# Altium schematic symbol library MCU_ST_STM32L4.SchLib: 319 symbols (part 3 of 8) (continued)
## STM32L4R9AIIx (continued)

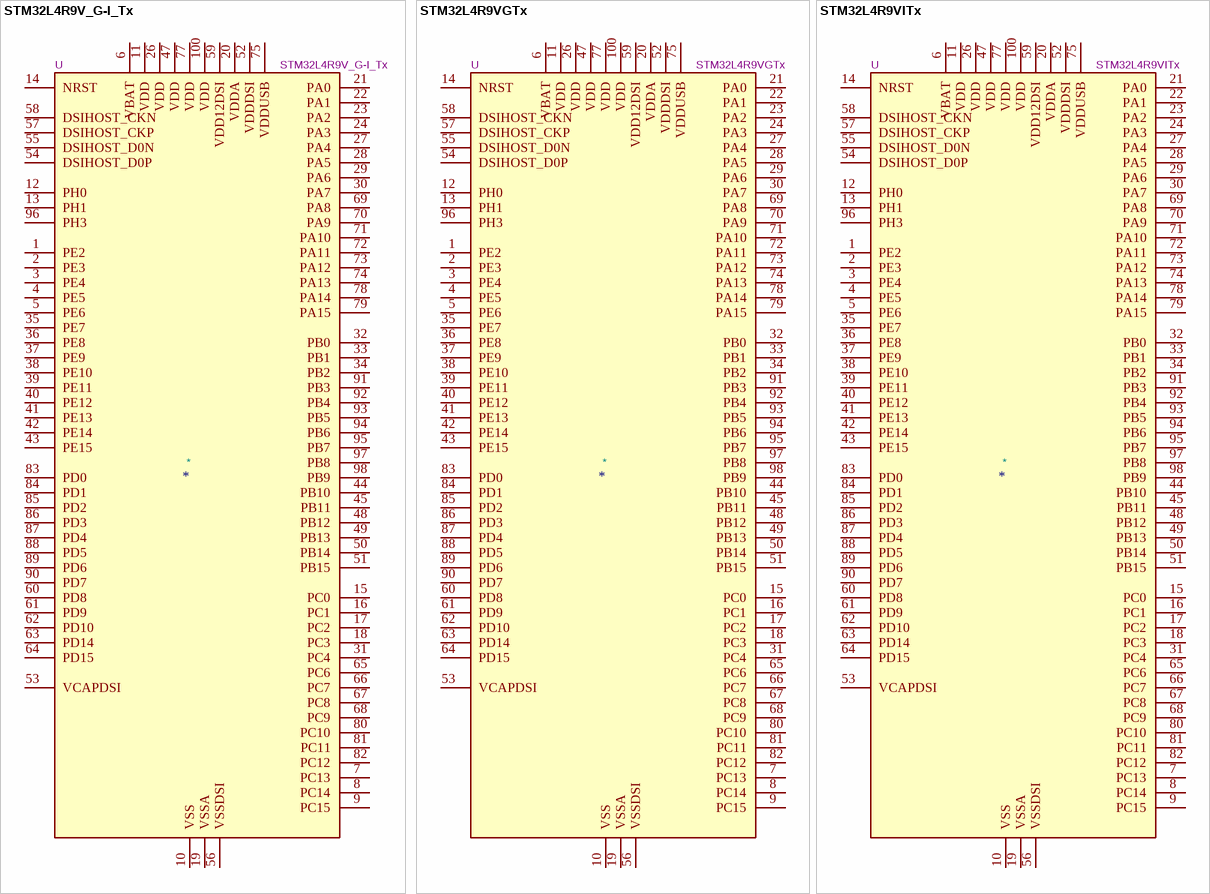
[diagram p22: symbols STM32L4R9V_G-I_Tx to STM32L4R9VITx]

## STM32L4R9V_G-I_Tx
designator *  value STM32L4R9V_G-I_Tx  Reference: U
ki_keywords: Arm Cortex-M4 STM32L4+ STM32L4R9/S9; ki_description: STMicroelectronics Arm Cortex-M4 MCU, 1024-2048KB flash, 640KB RAM, 120 MHz, 1.71-3.6V, 77 GPIO, LQFP100; ki_fp_filters: LQFP*14x14mm*P0.5mm*; Footprint: Package_QFP:LQFP-100_14x14mm_P0.5mm; Datasheet: https://www.st.com/resource/en/datasheet/stm32l4r9vg.pdf
pins: 1 PE2, 2 PE3, 3 PE4, 4 PE5, 5 PE6, 6 VBAT, 7 PC13, 8 PC14, 9 PC15, 10 VSS, 11 VDD, 12 PH0, 13 PH1, 14 NRST, 15 PC0, 16 PC1, 17 PC2, 18 PC3, 19 VSSA, 20 VDDA, 21 PA0, 22 PA1, 23 PA2, 24 PA3, 25 VSS hidden, 26 VDD, 27 PA4, 28 PA5, 29 PA6, 30 PA7, 31 PC4, 32 PB0, 33 PB1, 34 PB2, 35 PE7, 36 PE8, 37 PE9, 38 PE10, 39 PE11, 40 PE12, 41 PE13, 42 PE14, 43 PE15, 44 PB10, 45 PB11, 46 VSS hidden, 47 VDD, 48 PB12, 49 PB13, 50 PB14, 51 PB15, 52 VDDDSI, 53 VCAPDSI, 54 DSIHOST_D0P, 55 DSIHOST_D0N, 56 VSSDSI, 57 DSIHOST_CKP, 58 DSIHOST_CKN, 59 VDD12DSI, 60 PD8, 61 PD9, 62 PD10, 63 PD14, 64 PD15, 65 PC6, 66 PC7, 67 PC8, 68 PC9, 69 PA8, 70 PA9, 71 PA10, 72 PA11, 73 PA12, 74 PA13, 75 VDDUSB, 76 VSS hidden, 77 VDD, 78 PA14, 79 PA15, 80 PC10, 81 PC11, 82 PC12, 83 PD0, 84 PD1, 85 PD2, 86 PD3, 87 PD4, 88 PD5, 89 PD6, 90 PD7, 91 PB3, 92 PB4, 93 PB5, 94 PB6, 95 PB7, 96 PH3, 97 PB8, 98 PB9, 99 VSS hidden, 100 VDD

## STM32L4R9VGTx
designator *  value STM32L4R9VGTx  Reference: U
ki_keywords: Arm Cortex-M4 STM32L4+ STM32L4R9/S9; ki_description: STMicroelectronics Arm Cortex-M4 MCU, 1024KB flash, 640KB RAM, 120 MHz, 1.71-3.6V, 77 GPIO, LQFP100; ki_fp_filters: LQFP*14x14mm*P0.5mm*; Footprint: Package_QFP:LQFP-100_14x14mm_P0.5mm; Datasheet: https://www.st.com/resource/en/datasheet/stm32l4r9vg.pdf
pins: 1 PE2, 2 PE3, 3 PE4, 4 PE5, 5 PE6, 6 VBAT, 7 PC13, 8 PC14, 9 PC15, 10 VSS, 11 VDD, 12 PH0, 13 PH1, 14 NRST, 15 PC0, 16 PC1, 17 PC2, 18 PC3, 19 VSSA, 20 VDDA, 21 PA0, 22 PA1, 23 PA2, 24 PA3, 25 VSS hidden, 26 VDD, 27 PA4, 28 PA5, 29 PA6, 30 PA7, 31 PC4, 32 PB0, 33 PB1, 34 PB2, 35 PE7, 36 PE8, 37 PE9, 38 PE10, 39 PE11, 40 PE12, 41 PE13, 42 PE14, 43 PE15, 44 PB10, 45 PB11, 46 VSS hidden, 47 VDD, 48 PB12, 49 PB13, 50 PB14, 51 PB15, 52 VDDDSI, 53 VCAPDSI, 54 DSIHOST_D0P, 55 DSIHOST_D0N, 56 VSSDSI, 57 DSIHOST_CKP, 58 DSIHOST_CKN, 59 VDD12DSI, 60 PD8, 61 PD9, 62 PD10, 63 PD14, 64 PD15, 65 PC6, 66 PC7, 67 PC8, 68 PC9, 69 PA8, 70 PA9, 71 PA10, 72 PA11, 73 PA12, 74 PA13, 75 VDDUSB, 76 VSS hidden, 77 VDD, 78 PA14, 79 PA15, 80 PC10, 81 PC11, 82 PC12, 83 PD0, 84 PD1, 85 PD2, 86 PD3, 87 PD4, 88 PD5, 89 PD6, 90 PD7, 91 PB3, 92 PB4, 93 PB5, 94 PB6, 95 PB7, 96 PH3, 97 PB8, 98 PB9, 99 VSS hidden, 100 VDD

## STM32L4R9VITx
designator *  value STM32L4R9VITx  Reference: U
ki_keywords: Arm Cortex-M4 STM32L4+ STM32L4R9/S9; ki_description: STMicroelectronics Arm Cortex-M4 MCU, 2048KB flash, 640KB RAM, 120 MHz, 1.71-3.6V, 77 GPIO, LQFP100; ki_fp_filters: LQFP*14x14mm*P0.5mm*; Footprint: Package_QFP:LQFP-100_14x14mm_P0.5mm; Datasheet: https://www.st.com/resource/en/datasheet/stm32l4r9vi.pdf
pins: 1 PE2, 2 PE3, 3 PE4, 4 PE5, 5 PE6, 6 VBAT, 7 PC13, 8 PC14, 9 PC15, 10 VSS, 11 VDD, 12 PH0, 13 PH1, 14 NRST, 15 PC0, 16 PC1, 17 PC2, 18 PC3, 19 VSSA, 20 VDDA, 21 PA0, 22 PA1, 23 PA2, 24 PA3, 25 VSS hidden, 26 VDD, 27 PA4, 28 PA5, 29 PA6, 30 PA7, 31 PC4, 32 PB0, 33 PB1, 34 PB2, 35 PE7, 36 PE8, 37 PE9, 38 PE10, 39 PE11, 40 PE12, 41 PE13, 42 PE14, 43 PE15, 44 PB10, 45 PB11, 46 VSS hidden, 47 VDD, 48 PB12, 49 PB13, 50 PB14, 51 PB15, 52 VDDDSI, 53 VCAPDSI, 54 DSIHOST_D0P, 55 DSIHOST_D0N, 56 VSSDSI, 57 DSIHOST_CKP, 58 DSIHOST_CKN, 59 VDD12DSI, 60 PD8, 61 PD9, 62 PD10, 63 PD14, 64 PD15, 65 PC6, 66 PC7, 67 PC8, 68 PC9, 69 PA8, 70 PA9, 71 PA10, 72 PA11, 73 PA12, 74 PA13, 75 VDDUSB, 76 VSS hidden, 77 VDD, 78 PA14, 79 PA15, 80 PC10, 81 PC11, 82 PC12, 83 PD0, 84 PD1, 85 PD2, 86 PD3, 87 PD4, 88 PD5, 89 PD6, 90 PD7, 91 PB3, 92 PB4, 93 PB5, 94 PB6, 95 PB7, 96 PH3, 97 PB8, 98 PB9, 99 VSS hidden, 100 VDD

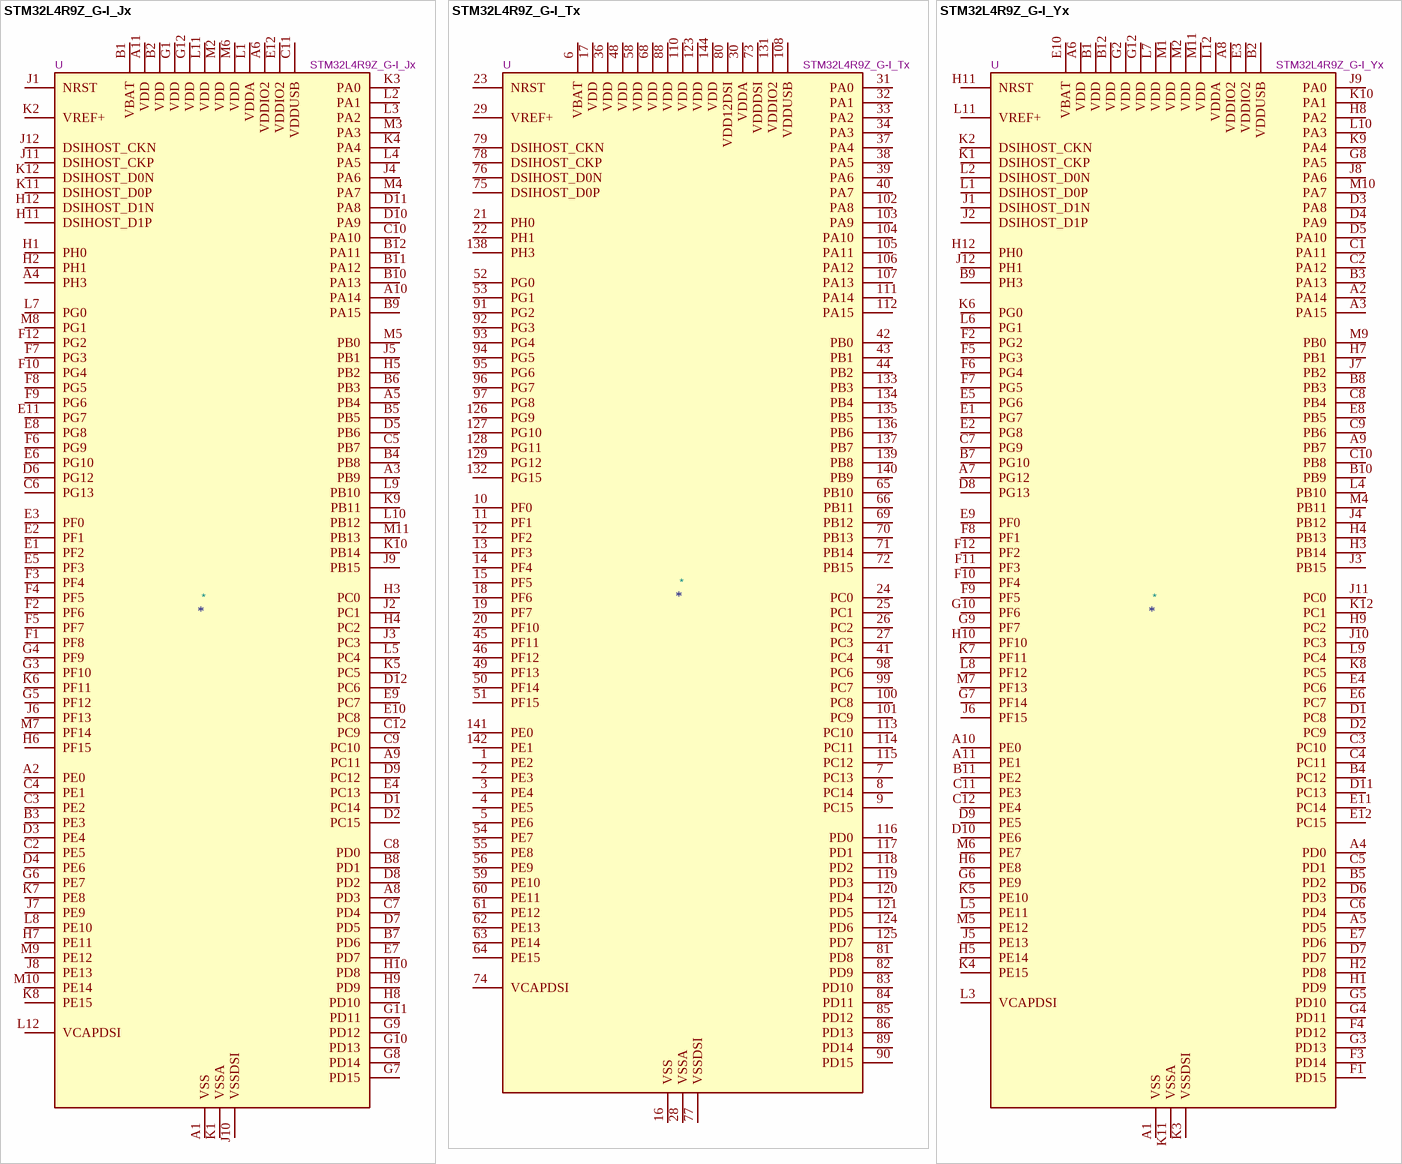
[diagram p23: symbols STM32L4R9Z_G-I_Jx to STM32L4R9Z_G-I_Yx]

## STM32L4R9Z_G-I_Jx
designator *  value STM32L4R9Z_G-I_Jx  Reference: U
ki_keywords: Arm Cortex-M4 STM32L4+ STM32L4R9/S9; ki_description: STMicroelectronics Arm Cortex-M4 MCU, 1024-2048KB flash, 640KB RAM, 120 MHz, 1.71-3.6V, 112 GPIO, UFBGA144; ki_fp_filters: *UFBGA*10x10mm*Layout12x12*P0.8mm*; Footprint: Package_BGA:UFBGA-144_10x10mm_Layout12x12_P0.8mm; Datasheet: https://www.st.com/resource/en/datasheet/stm32l4r9zg.pdf
pins: A1 VSS, A2 PE0, A3 PB9, A4 PH3, A5 PB4, A6 VDDIO2, A7 VSS hidden, A8 PD3, A9 PC11, A10 PA14, A11 VDD, A12 VSS hidden, B1 VBAT, B2 VDD, B3 PE3, B4 PB8, B5 PB5, B6 PB3, B7 PD6, B8 PD1, B9 PA15, B10 PA13, B11 PA12, B12 PA11, C1 VSS hidden, C2 PE5, C3 PE2, C4 PE1, C5 PB7, C6 PG13, C7 PD4, C8 PD0, C9 PC10, C10 PA10, C11 VDDUSB, C12 PC9, D1 PC14, D2 PC15, D3 PE4, D4 PE6, D5 PB6, D6 PG12, D7 PD5, D8 PD2, D9 PC12, D10 PA9, D11 PA8, D12 PC6, E1 PF2, E2 PF1, E3 PF0, E4 PC13, E5 PF3, E6 PG10, E7 PD7, E8 PG8, E9 PC7, E10 PC8, E11 PG7, E12 VDDIO2, F1 PF8, F2 PF6, F3 PF4, F4 PF5, F5 PF7, F6 PG9, F7 PG3, F8 PG5, F9 PG6, F10 PG4, F11 VSS hidden, F12 PG2, G1 VDD, G2 VSS hidden, G3 PF10, G4 PF9, G5 PF12, G6 PE7, G7 PD15, G8 PD14, G9 PD12, G10 PD13, G11 PD11, G12 VDD, H1 PH0, H2 PH1, H3 PC0, H4 PC2, H5 PB2, H6 PF15, H7 PE11, H8 PD10, H9 PD9, H10 PD8, H11 DSIHOST_D1P, H12 DSIHOST_D1N, J1 NRST, J2 PC1, J3 PC3, J4 PA6, J5 PB1, J6 PF13, J7 PE9, J8 PE13, J9 PB15, J10 VSSDSI, J11 DSIHOST_CKP, J12 DSIHOST_CKN, K1 VSSA, K2 VREF+, K3 PA0, K4 PA4, K5 PC5, K6 PF11, K7 PE8, K8 PE15, K9 PB11, K10 PB14, K11 DSIHOST_D0P, K12 DSIHOST_D0N, L1 VDDA, L2 PA1, L3 PA2, L4 PA5, L5 PC4, L6 VSS hidden, L7 PG0, L8 PE10, L9 PB10, L10 PB12, L11 VDD, L12 VCAPDSI, M1 VSS hidden, M2 VDD, M3 PA3, M4 PA7, M5 PB0, M6 VDD, M7 PF14, M8 PG1, M9 PE12, M10 PE14, M11 PB13, M12 VSS hidden

## STM32L4R9Z_G-I_Tx
designator *  value STM32L4R9Z_G-I_Tx  Reference: U
ki_keywords: Arm Cortex-M4 STM32L4+ STM32L4R9/S9; ki_description: STMicroelectronics Arm Cortex-M4 MCU, 1024-2048KB flash, 640KB RAM, 120 MHz, 1.71-3.6V, 110 GPIO, LQFP144; ki_fp_filters: LQFP*20x20mm*P0.5mm*; Footprint: Package_QFP:LQFP-144_20x20mm_P0.5mm; Datasheet: https://www.st.com/resource/en/datasheet/stm32l4r9zg.pdf
pins: 1 PE2, 2 PE3, 3 PE4, 4 PE5, 5 PE6, 6 VBAT, 7 PC13, 8 PC14, 9 PC15, 10 PF0, 11 PF1, 12 PF2, 13 PF3, 14 PF4, 15 PF5, 16 VSS, 17 VDD, 18 PF6, 19 PF7, 20 PF10, 21 PH0, 22 PH1, 23 NRST, 24 PC0, 25 PC1, 26 PC2, 27 PC3, 28 VSSA, 29 VREF+, 30 VDDA, 31 PA0, 32 PA1, 33 PA2, 34 PA3, 35 VSS hidden, 36 VDD, 37 PA4, 38 PA5, 39 PA6, 40 PA7, 41 PC4, 42 PB0, 43 PB1, 44 PB2, 45 PF11, 46 PF12, 47 VSS hidden, 48 VDD, 49 PF13, 50 PF14, 51 PF15, 52 PG0, 53 PG1, 54 PE7, 55 PE8, 56 PE9, 57 VSS hidden, 58 VDD, 59 PE10, 60 PE11, 61 PE12, 62 PE13, 63 PE14, 64 PE15, 65 PB10, 66 PB11, 67 VSS hidden, 68 VDD, 69 PB12, 70 PB13, 71 PB14, 72 PB15, 73 VDDDSI, 74 VCAPDSI, 75 DSIHOST_D0P, 76 DSIHOST_D0N, 77 VSSDSI, 78 DSIHOST_CKP, 79 DSIHOST_CKN, 80 VDD12DSI, 81 PD8, 82 PD9, 83 PD10, 84 PD11, 85 PD12, 86 PD13, 87 VSS hidden, 88 VDD, 89 PD14, 90 PD15, 91 PG2, 92 PG3, 93 PG4, 94 PG5, 95 PG6, 96 PG7, 97 PG8, 98 PC6, 99 PC7, 100 PC8, 101 PC9, 102 PA8, 103 PA9, 104 PA10, 105 PA11, 106 PA12, 107 PA13, 108 VDDUSB, 109 VSS hidden, 110 VDD, 111 PA14, 112 PA15, 113 PC10, 114 PC11, 115 PC12, 116 PD0, 117 PD1, 118 PD2, 119 PD3, 120 PD4, 121 PD5, 122 VSS hidden, 123 VDD, 124 PD6, 125 PD7, 126 PG9, 127 PG10, 128 PG11, 129 PG12, 130 VSS hidden, 131 VDDIO2, 132 PG15, 133 PB3, 134 PB4, 135 PB5, 136 PB6, 137 PB7, 138 PH3, 139 PB8, 140 PB9, 141 PE0, 142 PE1, 143 VSS hidden, 144 VDD

## STM32L4R9Z_G-I_Yx
designator *  value STM32L4R9Z_G-I_Yx  Reference: U
ki_keywords: Arm Cortex-M4 STM32L4+ STM32L4R9/S9; ki_description: STMicroelectronics Arm Cortex-M4 MCU, 1024-2048KB flash, 640KB RAM, 120 MHz, 1.71-3.6V, 110 GPIO, WLCSP144; ki_fp_filters: ST*WLCSP*Die470*; Footprint: Package_CSP:ST_WLCSP-144_Die470; Datasheet: https://www.st.com/resource/en/datasheet/stm32l4r9zg.pdf
pins: A1 VSS, A2 PA14, A3 PA15, A4 PD0, A5 PD5, A6 VDD, A7 PG12, A8 VDDIO2, A9 PB7, A10 PE0, A11 PE1, A12 VSS hidden, B1 VDD, B2 VDDUSB, B3 PA13, B4 PC12, B5 PD2, B6 VSS hidden, B7 PG10, B8 PB3, B9 PH3, B10 PB9, B11 PE2, B12 VDD, C1 PA11, C2 PA12, C3 PC10, C4 PC11, C5 PD1, C6 PD4, C7 PG9, C8 PB4, C9 PB6, C10 PB8, C11 PE3, C12 PE4, D1 PC8, D2 PC9, D3 PA8, D4 PA9, D5 PA10, D6 PD3, D7 PD7, D8 PG13, D9 PE5, D10 PE6, D11 PC13, D12 VSS hidden, E1 PG7, E2 PG8, E3 VDDIO2, E4 PC6, E5 PG6, E6 PC7, E7 PD6, E8 PB5, E9 PF0, E10 VBAT, E11 PC14, E12 PC15, F1 PD15, F2 PG2, F3 PD14, F4 PD12, F5 PG3, F6 PG4, F7 PG5, F8 PF1, F9 PF5, F10 PF4, F11 PF3, F12 PF2, G1 VSS hidden, G2 VDD, G3 PD13, G4 PD11, G5 PD10, G6 PE9, G7 PF14, G8 PA5, G9 PF7, G10 PF6, G11 VSS hidden, G12 VDD, H1 PD9, H2 PD8, H3 PB14, H4 PB13, H5 PE14, H6 PE8, H7 PB1, H8 PA2, H9 PC2, H10 PF10, H11 NRST, H12 PH0, J1 DSIHOST_D1N, J2 DSIHOST_D1P, J3 PB15, J4 PB12, J5 PE13, J6 PF15, J7 PB2, J8 PA6, J9 PA0, J10 PC3, J11 PC0, J12 PH1, K1 DSIHOST_CKP, K2 DSIHOST_CKN, K3 VSSDSI, K4 PE15, K5 PE10, K6 PG0, K7 PF11, K8 PC5, K9 PA4, K10 PA1, K11 VSSA, K12 PC1, L1 DSIHOST_D0P, L2 DSIHOST_D0N, L3 VCAPDSI, L4 PB10, L5 PE11, L6 PG1, L7 VDD, L8 PF12, L9 PC4, L10 PA3, L11 VREF+, L12 VDDA, M1 VDD, M2 VDD, M3 VSS hidden, M4 PB11, M5 PE12, M6 PE7, M7 PF13, M8 VSS hidden, M9 PB0, M10 PA7, M11 VDD, M12 VSS hidden

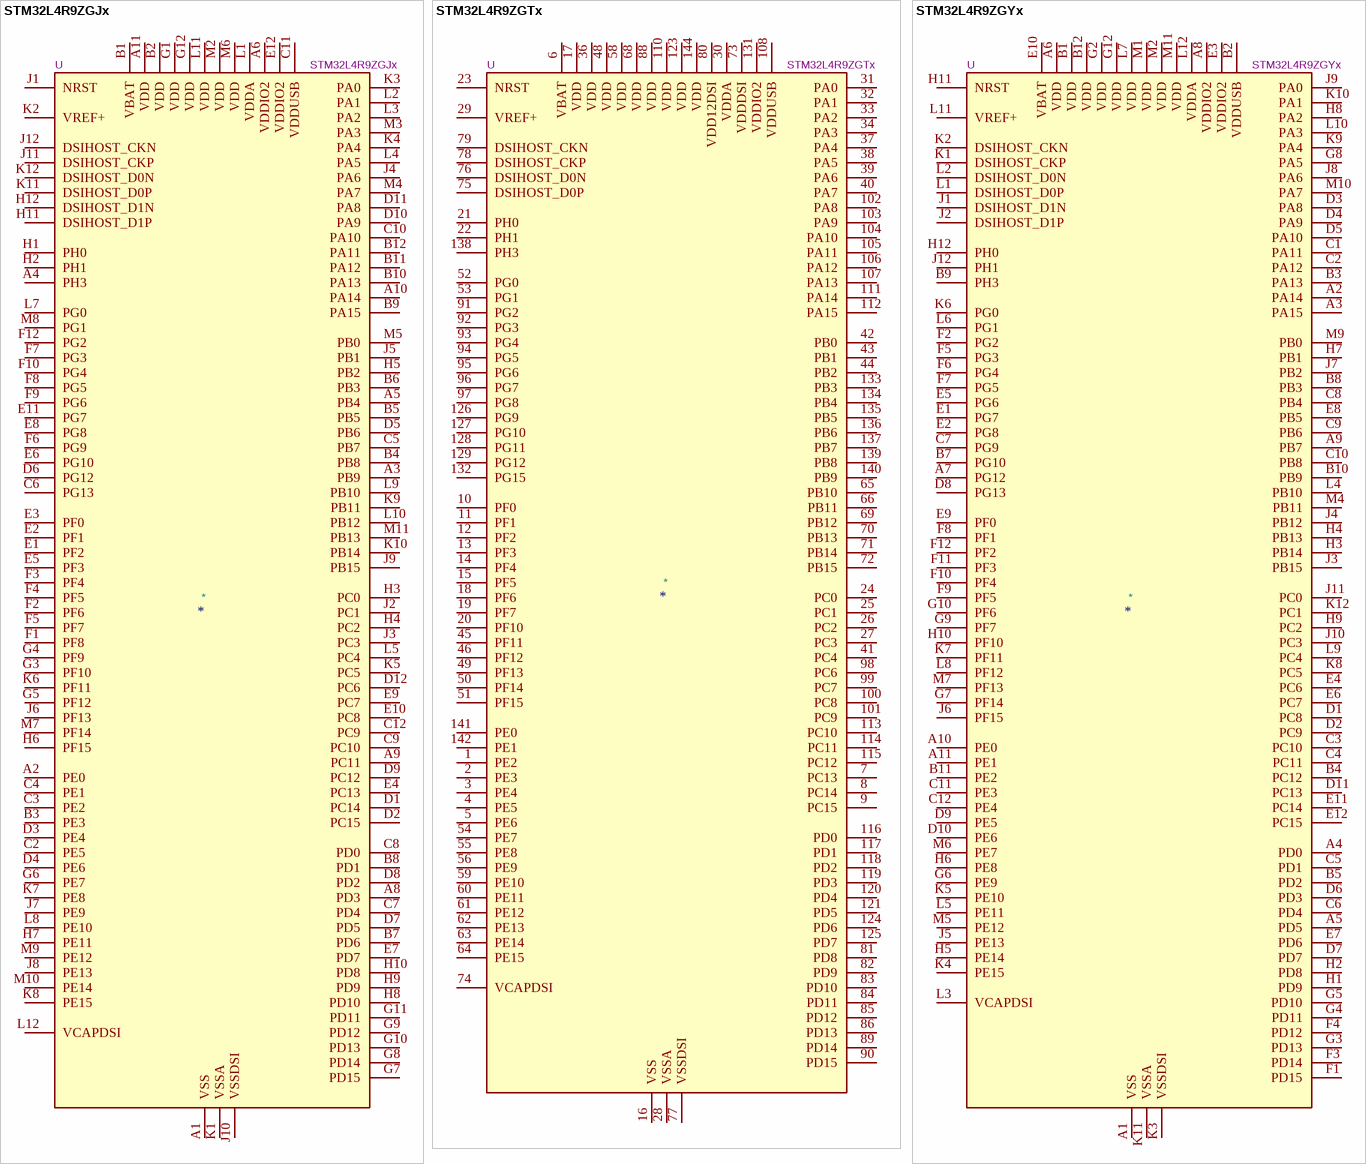
[diagram p24: symbols STM32L4R9ZGJx to STM32L4R9ZGYx]

## STM32L4R9ZGJx
designator *  value STM32L4R9ZGJx  Reference: U
ki_keywords: Arm Cortex-M4 STM32L4+ STM32L4R9/S9; ki_description: STMicroelectronics Arm Cortex-M4 MCU, 1024KB flash, 640KB RAM, 120 MHz, 1.71-3.6V, 112 GPIO, UFBGA144; ki_fp_filters: *UFBGA*10x10mm*Layout12x12*P0.8mm*; Footprint: Package_BGA:UFBGA-144_10x10mm_Layout12x12_P0.8mm; Datasheet: https://www.st.com/resource/en/datasheet/stm32l4r9zg.pdf
pins: A1 VSS, A2 PE0, A3 PB9, A4 PH3, A5 PB4, A6 VDDIO2, A7 VSS hidden, A8 PD3, A9 PC11, A10 PA14, A11 VDD, A12 VSS hidden, B1 VBAT, B2 VDD, B3 PE3, B4 PB8, B5 PB5, B6 PB3, B7 PD6, B8 PD1, B9 PA15, B10 PA13, B11 PA12, B12 PA11, C1 VSS hidden, C2 PE5, C3 PE2, C4 PE1, C5 PB7, C6 PG13, C7 PD4, C8 PD0, C9 PC10, C10 PA10, C11 VDDUSB, C12 PC9, D1 PC14, D2 PC15, D3 PE4, D4 PE6, D5 PB6, D6 PG12, D7 PD5, D8 PD2, D9 PC12, D10 PA9, D11 PA8, D12 PC6, E1 PF2, E2 PF1, E3 PF0, E4 PC13, E5 PF3, E6 PG10, E7 PD7, E8 PG8, E9 PC7, E10 PC8, E11 PG7, E12 VDDIO2, F1 PF8, F2 PF6, F3 PF4, F4 PF5, F5 PF7, F6 PG9, F7 PG3, F8 PG5, F9 PG6, F10 PG4, F11 VSS hidden, F12 PG2, G1 VDD, G2 VSS hidden, G3 PF10, G4 PF9, G5 PF12, G6 PE7, G7 PD15, G8 PD14, G9 PD12, G10 PD13, G11 PD11, G12 VDD, H1 PH0, H2 PH1, H3 PC0, H4 PC2, H5 PB2, H6 PF15, H7 PE11, H8 PD10, H9 PD9, H10 PD8, H11 DSIHOST_D1P, H12 DSIHOST_D1N, J1 NRST, J2 PC1, J3 PC3, J4 PA6, J5 PB1, J6 PF13, J7 PE9, J8 PE13, J9 PB15, J10 VSSDSI, J11 DSIHOST_CKP, J12 DSIHOST_CKN, K1 VSSA, K2 VREF+, K3 PA0, K4 PA4, K5 PC5, K6 PF11, K7 PE8, K8 PE15, K9 PB11, K10 PB14, K11 DSIHOST_D0P, K12 DSIHOST_D0N, L1 VDDA, L2 PA1, L3 PA2, L4 PA5, L5 PC4, L6 VSS hidden, L7 PG0, L8 PE10, L9 PB10, L10 PB12, L11 VDD, L12 VCAPDSI, M1 VSS hidden, M2 VDD, M3 PA3, M4 PA7, M5 PB0, M6 VDD, M7 PF14, M8 PG1, M9 PE12, M10 PE14, M11 PB13, M12 VSS hidden

## STM32L4R9ZGTx
designator *  value STM32L4R9ZGTx  Reference: U
ki_keywords: Arm Cortex-M4 STM32L4+ STM32L4R9/S9; ki_description: STMicroelectronics Arm Cortex-M4 MCU, 1024KB flash, 640KB RAM, 120 MHz, 1.71-3.6V, 110 GPIO, LQFP144; ki_fp_filters: LQFP*20x20mm*P0.5mm*; Footprint: Package_QFP:LQFP-144_20x20mm_P0.5mm; Datasheet: https://www.st.com/resource/en/datasheet/stm32l4r9zg.pdf
pins: 1 PE2, 2 PE3, 3 PE4, 4 PE5, 5 PE6, 6 VBAT, 7 PC13, 8 PC14, 9 PC15, 10 PF0, 11 PF1, 12 PF2, 13 PF3, 14 PF4, 15 PF5, 16 VSS, 17 VDD, 18 PF6, 19 PF7, 20 PF10, 21 PH0, 22 PH1, 23 NRST, 24 PC0, 25 PC1, 26 PC2, 27 PC3, 28 VSSA, 29 VREF+, 30 VDDA, 31 PA0, 32 PA1, 33 PA2, 34 PA3, 35 VSS hidden, 36 VDD, 37 PA4, 38 PA5, 39 PA6, 40 PA7, 41 PC4, 42 PB0, 43 PB1, 44 PB2, 45 PF11, 46 PF12, 47 VSS hidden, 48 VDD, 49 PF13, 50 PF14, 51 PF15, 52 PG0, 53 PG1, 54 PE7, 55 PE8, 56 PE9, 57 VSS hidden, 58 VDD, 59 PE10, 60 PE11, 61 PE12, 62 PE13, 63 PE14, 64 PE15, 65 PB10, 66 PB11, 67 VSS hidden, 68 VDD, 69 PB12, 70 PB13, 71 PB14, 72 PB15, 73 VDDDSI, 74 VCAPDSI, 75 DSIHOST_D0P, 76 DSIHOST_D0N, 77 VSSDSI, 78 DSIHOST_CKP, 79 DSIHOST_CKN, 80 VDD12DSI, 81 PD8, 82 PD9, 83 PD10, 84 PD11, 85 PD12, 86 PD13, 87 VSS hidden, 88 VDD, 89 PD14, 90 PD15, 91 PG2, 92 PG3, 93 PG4, 94 PG5, 95 PG6, 96 PG7, 97 PG8, 98 PC6, 99 PC7, 100 PC8, 101 PC9, 102 PA8, 103 PA9, 104 PA10, 105 PA11, 106 PA12, 107 PA13, 108 VDDUSB, 109 VSS hidden, 110 VDD, 111 PA14, 112 PA15, 113 PC10, 114 PC11, 115 PC12, 116 PD0, 117 PD1, 118 PD2, 119 PD3, 120 PD4, 121 PD5, 122 VSS hidden, 123 VDD, 124 PD6, 125 PD7, 126 PG9, 127 PG10, 128 PG11, 129 PG12, 130 VSS hidden, 131 VDDIO2, 132 PG15, 133 PB3, 134 PB4, 135 PB5, 136 PB6, 137 PB7, 138 PH3, 139 PB8, 140 PB9, 141 PE0, 142 PE1, 143 VSS hidden, 144 VDD

## STM32L4R9ZGYx
designator *  value STM32L4R9ZGYx  Reference: U
ki_keywords: Arm Cortex-M4 STM32L4+ STM32L4R9/S9; ki_description: STMicroelectronics Arm Cortex-M4 MCU, 1024KB flash, 640KB RAM, 120 MHz, 1.71-3.6V, 110 GPIO, WLCSP144; ki_fp_filters: ST*WLCSP*Die470*; Footprint: Package_CSP:ST_WLCSP-144_Die470; Datasheet: https://www.st.com/resource/en/datasheet/stm32l4r9zg.pdf
pins: A1 VSS, A2 PA14, A3 PA15, A4 PD0, A5 PD5, A6 VDD, A7 PG12, A8 VDDIO2, A9 PB7, A10 PE0, A11 PE1, A12 VSS hidden, B1 VDD, B2 VDDUSB, B3 PA13, B4 PC12, B5 PD2, B6 VSS hidden, B7 PG10, B8 PB3, B9 PH3, B10 PB9, B11 PE2, B12 VDD, C1 PA11, C2 PA12, C3 PC10, C4 PC11, C5 PD1, C6 PD4, C7 PG9, C8 PB4, C9 PB6, C10 PB8, C11 PE3, C12 PE4, D1 PC8, D2 PC9, D3 PA8, D4 PA9, D5 PA10, D6 PD3, D7 PD7, D8 PG13, D9 PE5, D10 PE6, D11 PC13, D12 VSS hidden, E1 PG7, E2 PG8, E3 VDDIO2, E4 PC6, E5 PG6, E6 PC7, E7 PD6, E8 PB5, E9 PF0, E10 VBAT, E11 PC14, E12 PC15, F1 PD15, F2 PG2, F3 PD14, F4 PD12, F5 PG3, F6 PG4, F7 PG5, F8 PF1, F9 PF5, F10 PF4, F11 PF3, F12 PF2, G1 VSS hidden, G2 VDD, G3 PD13, G4 PD11, G5 PD10, G6 PE9, G7 PF14, G8 PA5, G9 PF7, G10 PF6, G11 VSS hidden, G12 VDD, H1 PD9, H2 PD8, H3 PB14, H4 PB13, H5 PE14, H6 PE8, H7 PB1, H8 PA2, H9 PC2, H10 PF10, H11 NRST, H12 PH0, J1 DSIHOST_D1N, J2 DSIHOST_D1P, J3 PB15, J4 PB12, J5 PE13, J6 PF15, J7 PB2, J8 PA6, J9 PA0, J10 PC3, J11 PC0, J12 PH1, K1 DSIHOST_CKP, K2 DSIHOST_CKN, K3 VSSDSI, K4 PE15, K5 PE10, K6 PG0, K7 PF11, K8 PC5, K9 PA4, K10 PA1, K11 VSSA, K12 PC1, L1 DSIHOST_D0P, L2 DSIHOST_D0N, L3 VCAPDSI, L4 PB10, L5 PE11, L6 PG1, L7 VDD, L8 PF12, L9 PC4, L10 PA3, L11 VREF+, L12 VDDA, M1 VDD, M2 VDD, M3 VSS hidden, M4 PB11, M5 PE12, M6 PE7, M7 PF13, M8 VSS hidden, M9 PB0, M10 PA7, M11 VDD, M12 VSS hidden

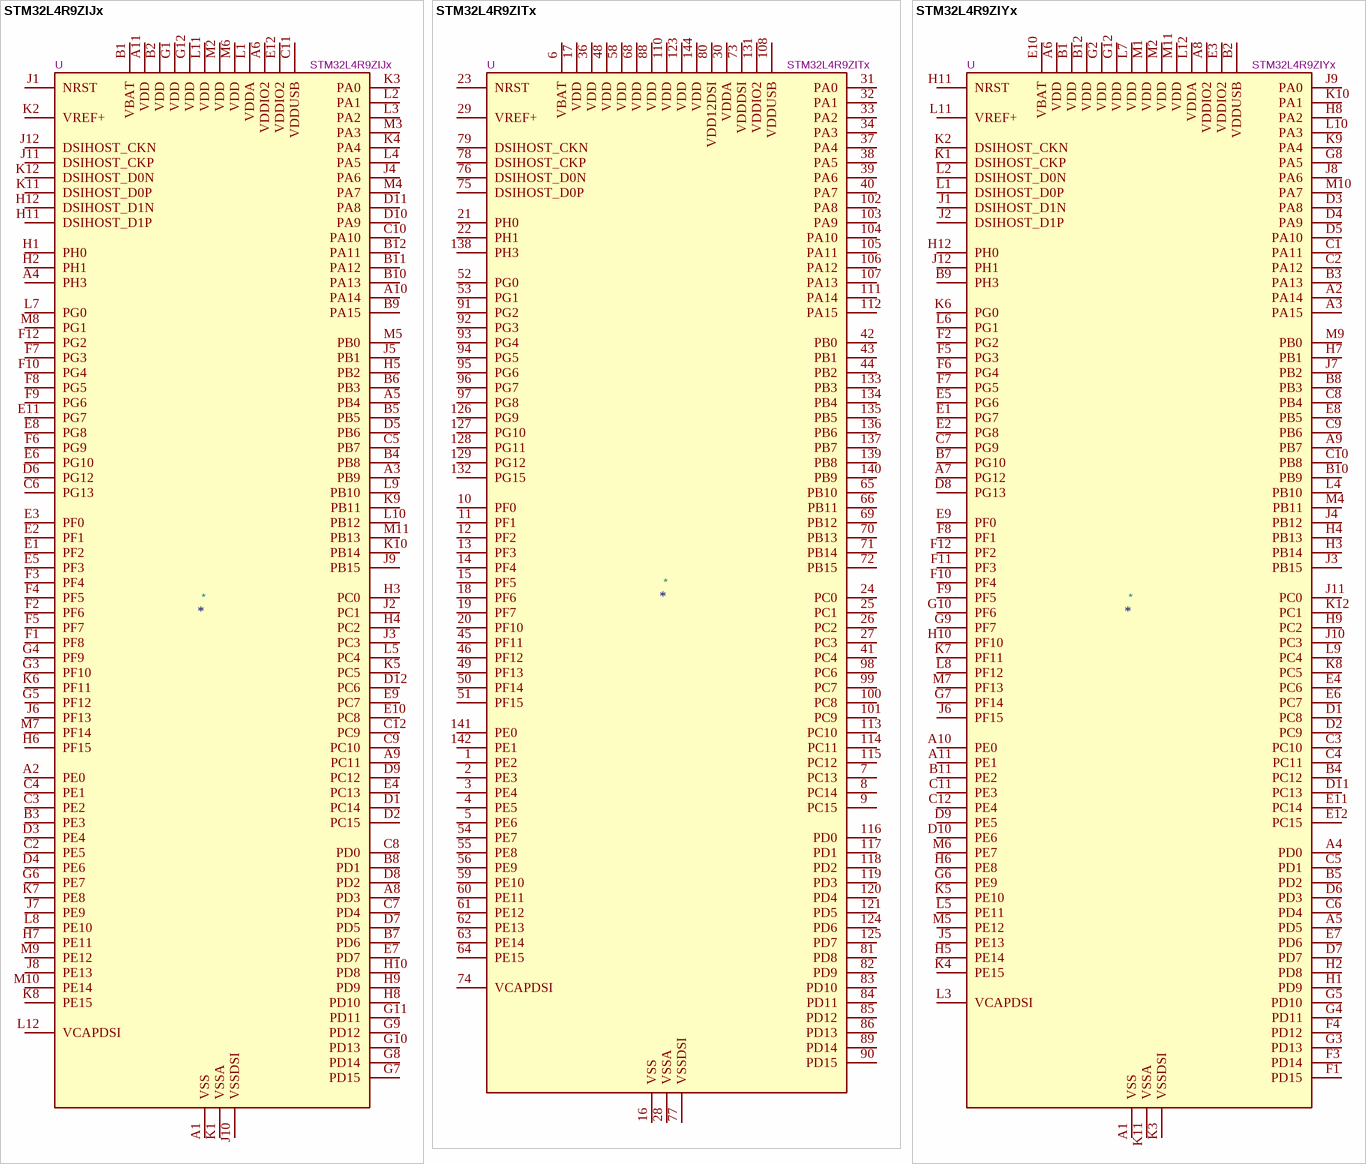
[diagram p25: symbols STM32L4R9ZIJx to STM32L4R9ZIYx]

## STM32L4R9ZIJx
designator *  value STM32L4R9ZIJx  Reference: U
ki_keywords: Arm Cortex-M4 STM32L4+ STM32L4R9/S9; ki_description: STMicroelectronics Arm Cortex-M4 MCU, 2048KB flash, 640KB RAM, 120 MHz, 1.71-3.6V, 112 GPIO, UFBGA144; ki_fp_filters: *UFBGA*10x10mm*Layout12x12*P0.8mm*; Footprint: Package_BGA:UFBGA-144_10x10mm_Layout12x12_P0.8mm; Datasheet: https://www.st.com/resource/en/datasheet/stm32l4r9zi.pdf
pins: A1 VSS, A2 PE0, A3 PB9, A4 PH3, A5 PB4, A6 VDDIO2, A7 VSS hidden, A8 PD3, A9 PC11, A10 PA14, A11 VDD, A12 VSS hidden, B1 VBAT, B2 VDD, B3 PE3, B4 PB8, B5 PB5, B6 PB3, B7 PD6, B8 PD1, B9 PA15, B10 PA13, B11 PA12, B12 PA11, C1 VSS hidden, C2 PE5, C3 PE2, C4 PE1, C5 PB7, C6 PG13, C7 PD4, C8 PD0, C9 PC10, C10 PA10, C11 VDDUSB, C12 PC9, D1 PC14, D2 PC15, D3 PE4, D4 PE6, D5 PB6, D6 PG12, D7 PD5, D8 PD2, D9 PC12, D10 PA9, D11 PA8, D12 PC6, E1 PF2, E2 PF1, E3 PF0, E4 PC13, E5 PF3, E6 PG10, E7 PD7, E8 PG8, E9 PC7, E10 PC8, E11 PG7, E12 VDDIO2, F1 PF8, F2 PF6, F3 PF4, F4 PF5, F5 PF7, F6 PG9, F7 PG3, F8 PG5, F9 PG6, F10 PG4, F11 VSS hidden, F12 PG2, G1 VDD, G2 VSS hidden, G3 PF10, G4 PF9, G5 PF12, G6 PE7, G7 PD15, G8 PD14, G9 PD12, G10 PD13, G11 PD11, G12 VDD, H1 PH0, H2 PH1, H3 PC0, H4 PC2, H5 PB2, H6 PF15, H7 PE11, H8 PD10, H9 PD9, H10 PD8, H11 DSIHOST_D1P, H12 DSIHOST_D1N, J1 NRST, J2 PC1, J3 PC3, J4 PA6, J5 PB1, J6 PF13, J7 PE9, J8 PE13, J9 PB15, J10 VSSDSI, J11 DSIHOST_CKP, J12 DSIHOST_CKN, K1 VSSA, K2 VREF+, K3 PA0, K4 PA4, K5 PC5, K6 PF11, K7 PE8, K8 PE15, K9 PB11, K10 PB14, K11 DSIHOST_D0P, K12 DSIHOST_D0N, L1 VDDA, L2 PA1, L3 PA2, L4 PA5, L5 PC4, L6 VSS hidden, L7 PG0, L8 PE10, L9 PB10, L10 PB12, L11 VDD, L12 VCAPDSI, M1 VSS hidden, M2 VDD, M3 PA3, M4 PA7, M5 PB0, M6 VDD, M7 PF14, M8 PG1, M9 PE12, M10 PE14, M11 PB13, M12 VSS hidden

## STM32L4R9ZITx
designator *  value STM32L4R9ZITx  Reference: U
ki_keywords: Arm Cortex-M4 STM32L4+ STM32L4R9/S9; ki_description: STMicroelectronics Arm Cortex-M4 MCU, 2048KB flash, 640KB RAM, 120 MHz, 1.71-3.6V, 110 GPIO, LQFP144; ki_fp_filters: LQFP*20x20mm*P0.5mm*; Footprint: Package_QFP:LQFP-144_20x20mm_P0.5mm; Datasheet: https://www.st.com/resource/en/datasheet/stm32l4r9zi.pdf
pins: 1 PE2, 2 PE3, 3 PE4, 4 PE5, 5 PE6, 6 VBAT, 7 PC13, 8 PC14, 9 PC15, 10 PF0, 11 PF1, 12 PF2, 13 PF3, 14 PF4, 15 PF5, 16 VSS, 17 VDD, 18 PF6, 19 PF7, 20 PF10, 21 PH0, 22 PH1, 23 NRST, 24 PC0, 25 PC1, 26 PC2, 27 PC3, 28 VSSA, 29 VREF+, 30 VDDA, 31 PA0, 32 PA1, 33 PA2, 34 PA3, 35 VSS hidden, 36 VDD, 37 PA4, 38 PA5, 39 PA6, 40 PA7, 41 PC4, 42 PB0, 43 PB1, 44 PB2, 45 PF11, 46 PF12, 47 VSS hidden, 48 VDD, 49 PF13, 50 PF14, 51 PF15, 52 PG0, 53 PG1, 54 PE7, 55 PE8, 56 PE9, 57 VSS hidden, 58 VDD, 59 PE10, 60 PE11, 61 PE12, 62 PE13, 63 PE14, 64 PE15, 65 PB10, 66 PB11, 67 VSS hidden, 68 VDD, 69 PB12, 70 PB13, 71 PB14, 72 PB15, 73 VDDDSI, 74 VCAPDSI, 75 DSIHOST_D0P, 76 DSIHOST_D0N, 77 VSSDSI, 78 DSIHOST_CKP, 79 DSIHOST_CKN, 80 VDD12DSI, 81 PD8, 82 PD9, 83 PD10, 84 PD11, 85 PD12, 86 PD13, 87 VSS hidden, 88 VDD, 89 PD14, 90 PD15, 91 PG2, 92 PG3, 93 PG4, 94 PG5, 95 PG6, 96 PG7, 97 PG8, 98 PC6, 99 PC7, 100 PC8, 101 PC9, 102 PA8, 103 PA9, 104 PA10, 105 PA11, 106 PA12, 107 PA13, 108 VDDUSB, 109 VSS hidden, 110 VDD, 111 PA14, 112 PA15, 113 PC10, 114 PC11, 115 PC12, 116 PD0, 117 PD1, 118 PD2, 119 PD3, 120 PD4, 121 PD5, 122 VSS hidden, 123 VDD, 124 PD6, 125 PD7, 126 PG9, 127 PG10, 128 PG11, 129 PG12, 130 VSS hidden, 131 VDDIO2, 132 PG15, 133 PB3, 134 PB4, 135 PB5, 136 PB6, 137 PB7, 138 PH3, 139 PB8, 140 PB9, 141 PE0, 142 PE1, 143 VSS hidden, 144 VDD

## STM32L4R9ZIYx
designator *  value STM32L4R9ZIYx  Reference: U
ki_keywords: Arm Cortex-M4 STM32L4+ STM32L4R9/S9; ki_description: STMicroelectronics Arm Cortex-M4 MCU, 2048KB flash, 640KB RAM, 120 MHz, 1.71-3.6V, 110 GPIO, WLCSP144; ki_fp_filters: ST*WLCSP*Die470*; Footprint: Package_CSP:ST_WLCSP-144_Die470; Datasheet: https://www.st.com/resource/en/datasheet/stm32l4r9zi.pdf
pins: A1 VSS, A2 PA14, A3 PA15, A4 PD0, A5 PD5, A6 VDD, A7 PG12, A8 VDDIO2, A9 PB7, A10 PE0, A11 PE1, A12 VSS hidden, B1 VDD, B2 VDDUSB, B3 PA13, B4 PC12, B5 PD2, B6 VSS hidden, B7 PG10, B8 PB3, B9 PH3, B10 PB9, B11 PE2, B12 VDD, C1 PA11, C2 PA12, C3 PC10, C4 PC11, C5 PD1, C6 PD4, C7 PG9, C8 PB4, C9 PB6, C10 PB8, C11 PE3, C12 PE4, D1 PC8, D2 PC9, D3 PA8, D4 PA9, D5 PA10, D6 PD3, D7 PD7, D8 PG13, D9 PE5, D10 PE6, D11 PC13, D12 VSS hidden, E1 PG7, E2 PG8, E3 VDDIO2, E4 PC6, E5 PG6, E6 PC7, E7 PD6, E8 PB5, E9 PF0, E10 VBAT, E11 PC14, E12 PC15, F1 PD15, F2 PG2, F3 PD14, F4 PD12, F5 PG3, F6 PG4, F7 PG5, F8 PF1, F9 PF5, F10 PF4, F11 PF3, F12 PF2, G1 VSS hidden, G2 VDD, G3 PD13, G4 PD11, G5 PD10, G6 PE9, G7 PF14, G8 PA5, G9 PF7, G10 PF6, G11 VSS hidden, G12 VDD, H1 PD9, H2 PD8, H3 PB14, H4 PB13, H5 PE14, H6 PE8, H7 PB1, H8 PA2, H9 PC2, H10 PF10, H11 NRST, H12 PH0, J1 DSIHOST_D1N, J2 DSIHOST_D1P, J3 PB15, J4 PB12, J5 PE13, J6 PF15, J7 PB2, J8 PA6, J9 PA0, J10 PC3, J11 PC0, J12 PH1, K1 DSIHOST_CKP, K2 DSIHOST_CKN, K3 VSSDSI, K4 PE15, K5 PE10, K6 PG0, K7 PF11, K8 PC5, K9 PA4, K10 PA1, K11 VSSA, K12 PC1, L1 DSIHOST_D0P, L2 DSIHOST_D0N, L3 VCAPDSI, L4 PB10, L5 PE11, L6 PG1, L7 VDD, L8 PF12, L9 PC4, L10 PA3, L11 VREF+, L12 VDDA, M1 VDD, M2 VDD, M3 VSS hidden, M4 PB11, M5 PE12, M6 PE7, M7 PF13, M8 VSS hidden, M9 PB0, M10 PA7, M11 VDD, M12 VSS hidden